# Altium footprint library 04.连接器件.pcb.PCBLIB: 363 footprints (part 6 of 23)
Each footprint in its own frame and in the unit in brackets; x right, y up, seen from the top. Pads: shape width x height; smd on the part's side, far side on the other; paste and mask are expansions set on the pad; w line width, h text height; cw(c..) or ccw(c..) is an arc to the next point about the centre after c.
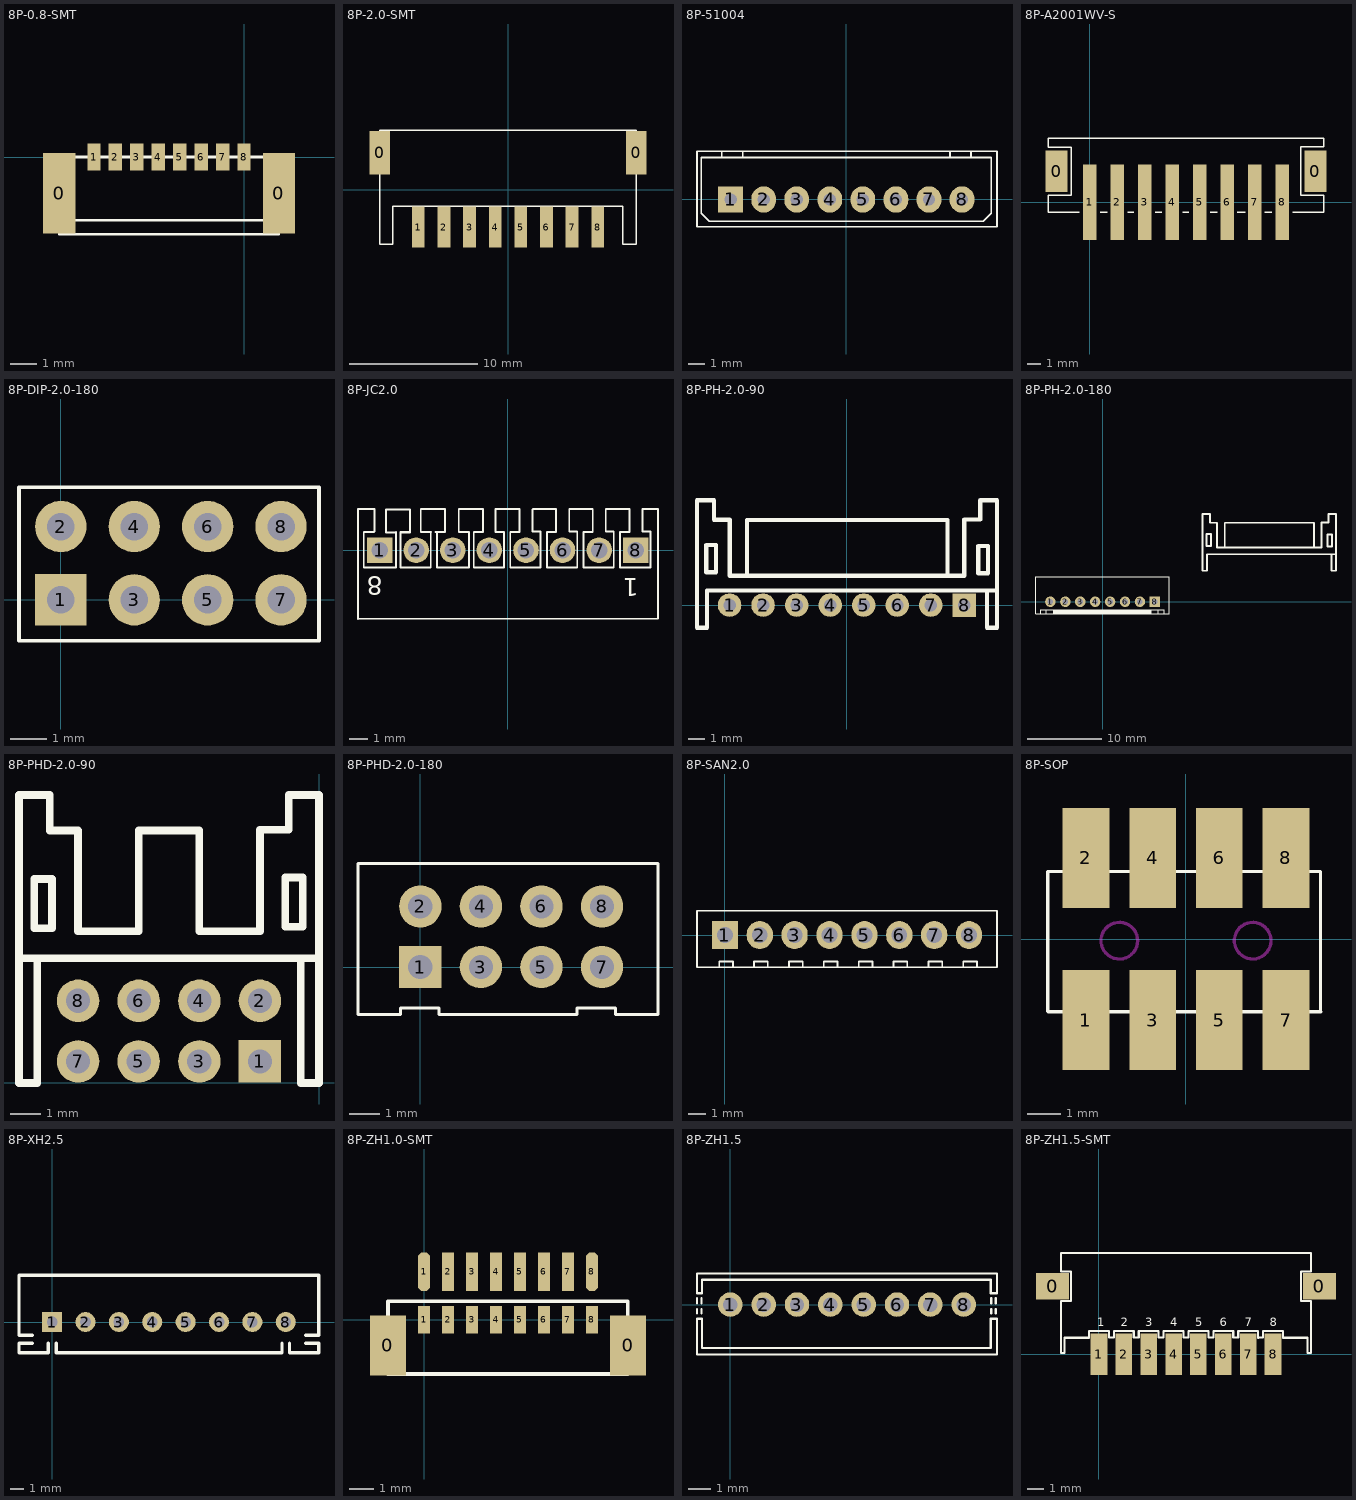
[diagram p5: the footprints below, top view; thin cyan lines are the x and y axes]

## 8P-0.8-SMT [mm]
pads (10):
  rect 1.2x3 smd: 0(-6.9,-1.35) 0(1.3,-1.35)
  rect 0.5x1 smd: 1(-5.6,0) 2(-4.8,0) 3(-4,0) 4(-3.2,0) 5(-2.4,0) 6(-1.6,0) 7(-0.8,0) 8(0,0)
TopOverlay:
  lines w0.1: 1.253,-2.363 -6.9,-2.363 ; -6.9,-2.363 -6.9,-2.889 1.3,-2.889 1.3,-1.932 1.3,0 -5.6,0 -6.279,0 -6.9,0 -6.9,-1.35 -6.9,-2.363
3D body: height 1.8, standoff 0, extent -6.9,-2.889 1.3,0

## 8P-2.0-SMT [mm]
pads (10):
  rect 1.6x3.4 smd: 0(-10,2.9) 0(10,2.9)
  rect 1x3.2 smd: 1(-7,-2.9) 2(-5,-2.9) 3(-3,-2.9) 4(-1,-2.9) 5(1,-2.9) 6(3,-2.9) 7(5,-2.9) 8(7,-2.9)
TopOverlay:
  lines w0.1: -8.93,4.628 10.018,4.628 10.018,-4.25 8.948,-4.25 8.948,-1.265 -6.25,-1.265 ; -6.219,-1.265 -9,-1.265 -9,-4.25 -10,-4.25 -10,4.628 -3.07,4.628
3D body: height 0.3, standoff 0, extent 6.511,-3.665 7.511,-0.503
3D body: height 0.3, standoff 0, extent 4.499,-3.649 5.499,-0.487
3D body: height 0.3, standoff 0, extent 2.498,-3.671 3.498,-0.508
3D body: height 0.3, standoff 0, extent 0.497,-3.692 1.497,-0.529
3D body: height 0.3, standoff 0, extent -1.504,-3.703 -0.504,-0.54
3D body: height 0.3, standoff 0, extent -3.378,-3.713 -2.378,-0.55
3D body: height 5.6, standoff 0, extent -10,-1.275 10.029,4.628
3D body: height 0.3, standoff 0, extent -7.5,-3.713 -6.5,-0.55
3D body: height 0.3, standoff 0, extent -5.5,-3.713 -4.5,-0.55
3D body: height 3.2, standoff 0, extent -10,-3.238 -9.3,-0.975
3D body: height 3.2, standoff 0, extent 9.269,-3.201 10.019,-0.939

## 8P-51004 [mm]
pads (8):
  rect 1.5x1.6 hole 0.75: 1(-7,0)
  oval 1.5x1.6 hole 0.75: 2(-5,0) 3(-3,0) 4(-1,0) 5(1,0) 6(3,0) 7(5,0) 8(7,0)
TopOverlay:
  lines w0.1: -7.54,2.54 -7.54,2.921 ; -6.27,2.54 -6.27,2.921 ; -4,-1.325 -8.282,-1.325 -8.774,-0.833 -8.774,2.54 1.245,2.54 ; -3.988,-1.325 8.282,-1.325 8.774,-0.833 8.774,2.54 1.226,2.54 ; 6.27,2.54 6.27,2.921 ; 7.54,2.54 7.54,2.921 ; -9.032,-1.651 9.115,-1.651 9.115,2.921 -9.032,2.921 -9.032,-1.651
3D body "510004-8.STEP": height 5.9, standoff -3.47, extent -8.958,-1.565 9.042,2.835

## 8P-A2001WV-S [mm]
pads (10):
  rect 1.6x3 smd: 0(-2.4,2.235) 0(16.4,2.235)
  rect 1x5.5 smd: 1(0,0) 2(2,0) 3(4,0) 4(6,0) 5(8,0) 6(10,0) 7(12,0) 8(14,0)
TopOverlay:
  lines w0.1: -3.001,4.657 -3.001,3.988 -1.357,3.988 -1.357,0.508 -3,0.508 -3,-0.743 -0.747,-0.743 ; -3,4.657 17,4.657 17,4.013 15.331,4.013 15.331,0.483 16.992,0.483 16.992,-0.743 ; 0.777,-0.743 1.26,-0.743 ; 2.784,-0.743 3.215,-0.743 ; 4.765,-0.743 5.247,-0.743 ; 6.771,-0.743 7.203,-0.743 ; 8.778,-0.743 9.286,-0.743 ; 10.708,-0.743 11.293,-0.743 ; 12.715,-0.743 13.248,-0.743 ; 14.772,-0.743 17,-0.743
3D body "A2001WV-8.STEP": height 5.9, standoff -0.25, extent -2.99,-2.769 17.01,4.661

## 8P-DIP-2.0-180 [mm]
pads (8):
  rect 1.4x1.4 hole 0.75: 1(0,0)
  round 1.4 hole 0.75: 2(0,2) 3(2,0) 4(2,2) 5(4,0) 6(4,2) 7(6,0) 8(6,2)
TopOverlay:
  lines w0.1: -1.143,-1.118 -1.143,3.073 7.036,3.073 7.036,-1.118 -1.143,-1.118
3D body "DIP8(2.0)排针.": height 8, standoff -2.6, extent -1.067,-1.016 6.933,2.984

## 8P-JC2.0 [mm]
pads (8):
  rect 1.4x1.4 hole 0.9: 1(-7,0) 8(7,0)
  round 1.4 hole 0.9: 2(-5,0) 3(-3,0) 4(-1,0) 5(1,0) 6(3,0) 7(5,0)
TopOverlay:
  lines w0.1: -7.851,0.991 -7.293,0.991 ; -7.845,0.991 -7.337,0.991 ; -7.305,0.991 -7.864,0.991 -7.864,-0.94 -6.111,-0.94 -6.111,0.991 ; -7.277,1.005 -7.277,2.25 -8.18,2.25 -8.18,-3.759 8.218,-3.75 8.218,1.832 8.218,2.25 7.8,2.25 7.377,2.25 7.362,2.235 7.362,1.016 7.8,1.016 7.8,-0.94 6.143,-0.94 6.143,0.991 6.651,0.991 6.651,2.25 5.377,2.25 ; -6.099,0.965 -6.658,0.965 -6.658,2.225 -5.337,2.225 -5.337,0.965 -5.845,0.965 ; -5.349,0.991 -5.857,0.991 -5.857,-0.94 -4.2,-0.94 -4.2,0.991 ; -4.194,0.991 -4.753,0.991 -4.753,2.25 -3.432,2.25 -3.432,0.991 -3.94,0.991 ; -3.864,0.991 -3.864,-0.94 -2.111,-0.94 -2.111,0.991 -2.67,0.991 -2.67,2.25 -1.349,2.25 -1.349,0.991 -1.857,0.991 -1.857,-0.94 -0.2,-0.94 -0.2,0.991 -0.67,0.991 -0.67,2.25 0.651,2.25 0.651,0.991 0.143,0.991 0.143,-0.94 1.8,-0.94 1.8,1.016 1.362,1.016 1.362,2.235 1.377,2.25 2.651,2.25 2.651,0.991 2.143,0.991 2.143,-0.94 3.8,-0.94 3.8,1.016 3.362,1.016 3.362,2.235 3.377,2.25 3.8,2.25 4.651,2.25 4.651,0.991 4.143,0.991 4.143,-0.94 5.8,-0.94 5.8,1.016 5.362,1.016 5.362,2.235 ; -0.638,2.235 -0.623,2.25 -0.2,2.25
  text "1" at 7.152,-1.524 h1
  text "8" at -6.818,-1.448 h1
3D body "8P-JC2.0.STEP": height 3.4, standoff -3.22, extent -8.23,-3.812 8.27,7.188

## 8P-PH-2.0-90 [mm]
pads (8):
  round 1.4 hole 0.75: 1(-7,0) 2(-5,0) 3(-3,0) 4(-1,0) 5(1,0) 6(3,0) 7(5,0)
  rect 1.4x1.4 hole 0.75: 8(7,0)
TopOverlay:
  lines w0.254: -8.348,0.865 -4.35,0.865 8.95,0.865 ; -8.342,0.868 -8.342,-1.346 -8.942,-1.346 -8.942,6.254 -7.932,6.254 -7.932,5.085 -6.992,5.085 -6.992,1.757 ; -6.988,1.754 -3,1.754 7,1.754 7,5.107 7.95,5.107 7.95,6.25 8.95,6.25 8.95,-1.35 8.35,-1.35 8.35,0.865 ; -5.953,1.754 -5.953,5.081 5.877,5.081 ; 6,1.754 6,5.081 ; 8.377,0.865 8.827,0.865 ; -8.389,1.959 -7.805,1.959 -7.805,3.585 -8.389,3.585 -8.389,1.959 ; 7.832,1.906 7.832,3.532 8.417,3.532 8.417,1.906 7.832,1.906
3D body: height 5, standoff 0, extent -8.93,-1.35 8.95,6.25

## 8P-PH-2.0-180 [mm]
pads (8):
  round 1.4 hole 0.75: 1(-7,0) 2(-5,0) 3(-3,0) 4(-1,0) 5(1,0) 6(3,0) 7(5,0)
  rect 1.4x1.4 hole 0.75: 8(7,0)
TopOverlay:
  rectangle: -6.679,-1.63 6.542,-1.051
  lines w0.127: -8.287,-1.63 -8.287,-1.063 -7.526,-1.063 ; -7.526,-1.613 -7.526,-1.063 ; 7.46,-1.063 -7.526,-1.063 ; 7.481,-1.61 7.481,-1.063 8.242,-1.063 8.242,-1.593 ; -8.93,-1.636 -8.93,3.371 8.95,3.371 8.95,-1.636 -8.93,-1.636
  lines w0.254: 13.975,6.364 17.973,6.364 31.273,6.364 ; 13.981,6.367 13.981,4.152 13.381,4.152 13.381,11.752 14.391,11.752 14.391,10.584 15.331,10.584 15.331,7.256 ; 15.334,7.253 19.323,7.253 29.323,7.253 29.323,10.605 30.273,10.605 30.273,11.749 31.273,11.749 31.273,4.149 30.673,4.149 30.673,6.364 ; 16.37,7.253 16.37,10.58 28.199,10.58 ; 28.323,7.253 28.323,10.58 ; 30.699,6.364 31.149,6.364 ; 13.934,7.458 13.934,9.084 14.518,9.084 14.518,7.458 13.934,7.458 ; 30.155,7.405 30.739,7.405 30.739,9.031 30.155,9.031 30.155,7.405
3D body: height 5, standoff 0, extent -8.93,-1.636 8.95,3.371

## 8P-PHD-2.0-90 [mm]
pads (8):
  rect 1.4x1.4 hole 0.8: 1(-1.95,0.711)
  round 1.4 hole 0.8: 2(-1.95,2.711) 3(-3.95,0.711) 4(-3.95,2.711) 5(-5.95,0.711) 6(-5.95,2.711) 7(-7.95,0.711) 8(-7.95,2.711)
TopOverlay:
  lines w0.254: -9.9,4.115 -0.608,4.115 ; -9.3,4.115 -9.3,0 -9.9,0 -9.9,9.5 -8.89,9.5 -8.89,8.331 -7.95,8.331 -7.95,5.004 -5.95,5.004 -5.95,8.331 -3.95,8.331 -3.95,5.004 -1.95,5.004 -1.95,8.357 -1,8.357 -1,9.5 0,9.5 0,0 -0.6,0 -0.6,4.115 ; -0.573,4.115 -0.123,4.115 ; -9.398,5.105 -8.814,5.105 -8.814,6.731 -9.398,6.731 -9.398,5.105 ; -1.118,5.156 -0.533,5.156 -0.533,6.782 -1.118,6.782 -1.118,5.156
3D body: height 5, standoff 0, extent -9.9,0 0,9.5

## 8P-PHD-2.0-180 [mm]
pads (8):
  rect 1.4x1.4 hole 0.8: 1(0,0)
  round 1.4 hole 0.8: 2(0,2) 3(2,0) 4(2,2) 5(4,0) 6(4,2) 7(6,0) 8(6,2)
TopOverlay:
  lines w0.1: -2.057,-1.575 -2.057,3.425 7.849,3.425 7.849,-1.575 6.452,-1.575 6.452,-1.346 5.182,-1.346 5.182,-1.575 0.61,-1.575 0.61,-1.346 -0.66,-1.346 -0.66,-1.575 -2.057,-1.575
3D body "IDC8(2.0).STEP": height 6.5, standoff -2.6, extent -2.079,-1.571 7.921,3.429

## 8P-SAN2.0 [mm]
pads (8):
  rect 1.5x1.6 hole 0.9: 1(0,0)
  oval 1.5x1.6 hole 0.9: 2(2,0) 3(4,0) 4(6,0) 5(8,0) 6(10,0) 7(12,0) 8(14,0)
TopOverlay:
  lines w0.1: -1.6,-1.85 -1.6,1.4 15.545,1.4 ; -1.575,-1.854 15.57,-1.854 ; -0.33,-1.85 -0.33,-1.524 0.457,-1.524 0.457,-1.85 ; 1.67,-1.85 1.67,-1.524 2.457,-1.524 2.457,-1.85 ; 3.67,-1.85 3.67,-1.524 4.457,-1.524 4.457,-1.85 ; 5.67,-1.85 5.67,-1.524 6.457,-1.524 6.457,-1.85 ; 7.67,-1.85 7.67,-1.524 8.457,-1.524 8.457,-1.85 ; 9.67,-1.85 9.67,-1.524 10.457,-1.524 10.457,-1.85 ; 11.67,-1.85 11.67,-1.524 12.457,-1.524 12.457,-1.85 ; 13.67,-1.85 13.67,-1.524 14.457,-1.524 14.457,-1.85 ; 15.592,-1.85 15.6,-1.842 ; 15.601,-1.854 15.601,1.397
3D body "8P-SAN2.0.STEP": height 11, standoff -3.19, extent -1.626,-1.88 15.574,1.37

## 8P-SOP [mm]
pads (8):
  rect 1.4x3 smd: 1(-3,-2.432) 2(-3,2.432) 3(-1,-2.432) 4(-1,2.432) 5(1,-2.432) 6(1,2.432) 7(3,-2.432) 8(3,2.432)
TopOverlay:
  lines w0.1: -4.143,-2.168 -4.143,2.023 4.036,2.023 4.036,-2.168 ; -4.14,-2.184 4.039,-2.184
KeepOutLayer:
  circle w0.1: c-2,-0.051 r0.55
  circle w0.1: c2,-0.051 r0.55
3D body: height 4.3, standoff 0, extent -4.1,-2.126 4,1.974

## 8P-XH2.5 [mm]
pads (8):
  rect 1.5x1.5 hole 0.8: 1(0,0)
  round 1.5 hole 0.8: 2(2.5,0) 3(5,0) 4(7.5,0) 5(10,0) 6(12.5,0) 7(15,0) 8(17.5,0)
TopOverlay:
  lines w0.254: -1.48,-1.6 -2.48,-1.6 -2.48,-2.3 -0.58,-2.3 ; -1.48,-1 -2.48,-1 -2.48,3.5 5.02,3.5 19.99,3.5 ; -0.88,-2.3 -0.28,-2.3 -0.28,-1.6 ; 0.32,-1.6 0.32,-2.3 0.62,-2.3 1.62,-2.3 17.1,-2.3 ; 16.9,-2.3 17.221,-2.3 17.221,-1.6 ; 17.78,-1.6 17.78,-2.3 18.38,-2.3 ; 18.08,-2.3 19.98,-2.3 19.98,-1.6 18.98,-1.6 ; 18.98,-1 19.98,-1 19.98,3.5
3D body "8PIN-XH2.5.STEP": height 5.9, standoff -3.47, extent -2.464,-2.337 19.936,3.413

## 8P-ZH1.0-SMT [mm]
pads (18):
  rect 1.5x2.5 smd: 0(-1.506,-1.071) 0(8.506,-1.071)
  rect 0.5x1.15 smd: 1(0,0) 2(1,0) 3(2,0) 4(3,0) 5(4,0) 6(5,0) 7(6,0) 8(7,0)
  oct 0.5x1.6 smd: 1(0,2) 8(7,2)
  rect 0.5x1.6 smd: 2(1,2) 3(2,2) 4(3,2) 5(4,2) 6(5,2) 7(6,2)
TopOverlay:
  lines w0.15: -1.506,-2.264 8.5,-2.264 8.5,0.767 -1.506,0.767 -1.506,-0.497 -1.506,-1.001 -1.506,-2.264
3D body: height 2.75, standoff 1, extent -0.075,-1.65 0.075,-1.5
3D body: height 2.75, standoff 1, extent 0.925,-1.65 1.075,-1.5
3D body: height 2.75, standoff 1, extent 1.925,-1.65 2.075,-1.5
3D body: height 2.75, standoff 1, extent 2.925,-1.65 3.075,-1.5
3D body: height 2.75, standoff 1, extent 3.925,-1.65 4.075,-1.5
3D body: height 2.75, standoff 1, extent 4.925,-1.65 5.075,-1.5
3D body: height 2.75, standoff 1, extent 5.925,-1.65 6.075,-1.5
3D body: height 2.75, standoff 1, extent 6.925,-1.65 7.075,-1.5
3D body: height 2.75, standoff 1, extent 7.5,-2 7.9,-1.4
3D body: height 2.75, standoff 1, extent 7.5,-0.9 7.9,-0.1
3D body: height 2.75, standoff 1, extent 7.9,-2 8.5,-0.1
3D body: height 2.75, standoff 1, extent -0.239,-2 7.5,-1.8
3D body: height 2.75, standoff 1, extent -0.339,-0.3 7.5,-0.1
3D body: height 1, standoff 0, extent -1.506,-2.264 8.485,0.767
3D body: height 2.75, standoff 1, extent -0.992,-2.007 -0.392,-0.107
3D body: height 2.75, standoff 1, extent -0.39,-0.908 -0.19,-0.108
3D body: height 2.75, standoff 1, extent -0.39,-2.002 -0.19,-1.402

## 8P-ZH1.5 [mm]
pads (8):
  round 1.1 hole 0.65: 1(0,0) 2(1.5,0) 3(3,0) 4(4.5,0) 5(6,0) 6(7.5,0) 7(9,0) 8(10.5,0)
TopOverlay:
  lines w0.1: -1.499,-0.406 -1.499,-0.203 ; -1.499,0.051 -1.499,0.279 ; -1.295,-0.406 -1.295,-0.203 ; -1.295,0.051 -1.295,0.279 ; 11.742,-0.406 11.742,-0.203 ; 11.742,0.051 11.742,0.279 ; 11.945,-0.406 11.945,-0.203 ; 11.945,0.051 11.945,0.279 ; 11.991,1.4 12,1.391 12,0.508 11.716,0.508 11.716,1.118 -1.27,1.118 -1.27,0.508 -1.5,0.508 -1.5,1.4 12,1.4 ; 12,-0.682 12,-2.25 -1.5,-2.25 -1.5,-0.635 -1.27,-0.635 -1.27,-1.956 11.716,-1.956 11.716,-0.635 12,-0.635
3D body "8P-ZH1.5.STEP": height 4.6, standoff -2.45, extent -1.499,-2.286 12.001,1.364

## 8P-ZH1.5-SMT [mm]
pads (10):
  rect 2x1.6 smd: 0(-2.8,4.1) 0(13.3,4.1)
  rect 1x2.5 smd: 1(0,0) 2(1.5,0) 3(3,0) 4(4.5,0) 5(6,0) 6(7.5,0) 7(9,0) 8(10.5,0)
TopOverlay:
  lines w0.127: 9.61,0.99 9.6,1 ; 8.4,1 8.1,1 8.1,1.4 6.9,1.4 6.9,1 6.6,1 6.6,1.4 5.4,1.4 5.4,1 5.1,1 5.1,1.4 3.9,1.4 3.9,1 3.6,1 3.6,1.4 2.4,1.4 2.4,1 2.1,1 2.1,1.4 0.9,1.4 0.9,1 0.6,1 0.6,1.4 -0.6,1.4 -0.6,1 -0.61,0.99 -2.07,0.99 -2.07,0.07 -2.3,0.07 -2.3,3.2 -1.7,3.2 -1.7,5 -2.3,5 -2.3,6.1 11.2,6.1 12.8,6.1 12.8,5 12.2,5 12.2,3.2 12.8,3.2 12.8,0.07 12.57,0.07 12.57,0.99 11.11,0.99 ; 8.4,1 8.4,1.4 ; 8.4,1 8.4,1.4 ; 8.4,1.4 9.6,1.4 ; 8.4,1.4 9.6,1.4 ; 9.6,1 9.6,1.4 ; 9.6,1 9.6,1.4 ; 9.6,1 9.9,1 9.9,1.4 11.1,1.4 ; 11.1,1 11.1,1.4 ; 11.1,1 11.11,0.99 ; 11.1,1 11.11,0.99 ; 11.1,1 11.1,1.4
  text "6" at 7.3,1.7 h0.5
  text "7" at 8.8,1.7 h0.5
  text "1" at -0.1,1.7 h0.5
  text "2" at 1.3,1.7 h0.5
  text "3" at 2.8,1.7 h0.5
  text "4" at 4.3,1.7 h0.5
  text "5" at 5.8,1.7 h0.5
  text "8" at 10.3,1.7 h0.5
3D body "8P-ZH1.5-SMT.STEP": height 3.7, standoff -0.25, extent -2.21,-0.33 12.79,6.17